# Altium footprint library HedefProjem.PcbLib: 35 footprints (part 3 of 3)
Each footprint in its own frame and in the unit in brackets; x right, y up, seen from the top. Pads: shape width x height; smd on the part's side, far side on the other; paste and mask are expansions set on the pad; w line width, h text height; cw(c..) or ccw(c..) is an arc to the next point about the centre after c.
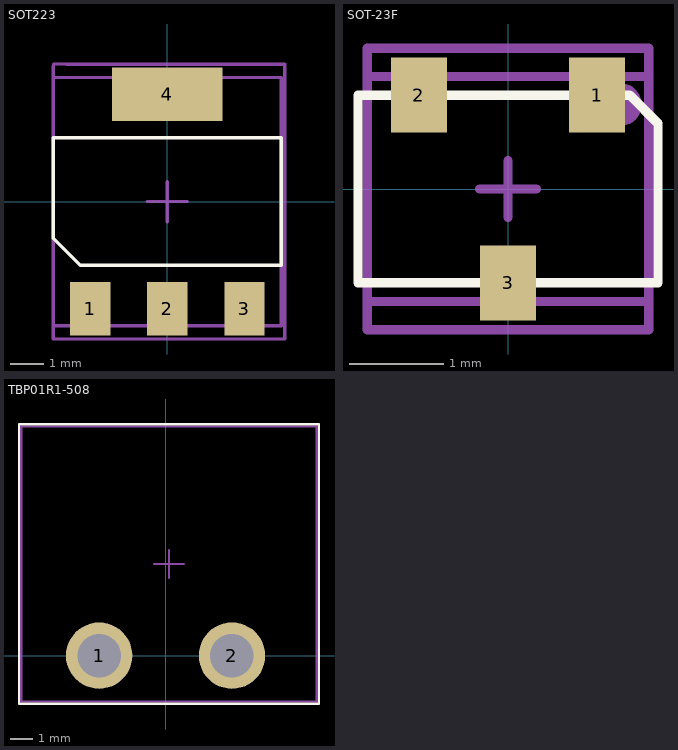
[diagram p2: the footprints below, top view; thin cyan lines are the x and y axes]

## SOT223 [mm]
pads (4):
  rect 1.2x1.6 smd mask+0.05: 1(-2.3,-3.2) 2(0,-3.2) 3(2.3,-3.2)
  rect 3.3x1.6 smd mask+0.05: 4(0,3.2)
Top Overlay:
  lines w0.1: -3.4,-1.1 -2.6,-1.9 3.4,-1.9 3.4,1.9 -3.4,1.9 -3.4,-1.1
Top 3D Body:
  circle w0.3: c-2.6,-3.2 r0.141
  lines w0.1: -3.4,-3.7 -3.4,3.7 3.4,3.7 3.4,-3.7 -3.4,-3.7
Top Component Center:
  lines w0.1: -0.6,0 0.6,0 ; 0,-0.6 0,0.6 ; -3.4,-3.7 3.4,-3.7 3.4,3.7 -3.4,3.7 -3.4,-3.7
Top Designator:
  lines w0.1: -3.4,-4.1 3.5,-4.1 3.5,4.1 -3,4.1 -3.398,4.105 -3.4,4 -3.4,-4.1
  text ".Designator" at -1.446,0.062 h1.52
3D body "sot223_p2-3_l6-7_w3-7.stp": height 1.85, standoff 0.05, extent -3.35,-3.65 3.35,3.65

## SOT-23F [mm]
pads (3):
  rect 0.6x0.8 smd mask+0.05: 1(0.95,1) 2(-0.95,1) 3(0,-1)
Top Overlay:
  lines w0.1: -1.6,-1 -1.6,1 1.3,1 1.6,0.7 1.6,-1 -1.6,-1
Top 3D Body:
  circle w0.254: c1.2,0.9 r0.1
  lines w0.1: -1.5,-1.2 -1.5,1.2 1.5,1.2 1.5,-1.2 -1.5,-1.2
Top Component Center:
  lines w0.1: -0.3,0 0.3,0 ; 0,-0.3 0,0.3 ; -1.5,-1.5 -1.5,1.5 1.5,1.5 1.5,-1.5 -1.5,-1.5
Top Designator:
  lines w0.1: -1.5,-1.5 -1.5,1.5 1.5,1.5 1.5,-1.5 -1.5,-1.5
  text ".Designator" at -0.95,-0.483 h0.8
3D body "User Library-SOT23F.STEP": height 1.01, standoff 0.1, extent -1.45,-1.2 1.45,1.2

## TBP01R1-508 [mm]
pads (2):
  round 2.9 hole 1.9 mask+0.05: 1(-2.9,0) 2(2.9,0)
Top Overlay:
  lines w0.1: -6.4,-2.1 6.7,-2.1 6.7,10.1 -6.4,10.1 -6.4,-2.1
Top 3D Body:
  lines w0.1: -6.3,-2 6.6,-2 6.6,10 -6.3,10 -6.3,-2
Top Component Center:
  lines w0.1: -0.5,4 0.8,4 ; 0.15,3.4 0.15,4.6 ; -6.3,-2 6.6,-2 6.6,10 -6.3,10 -6.3,-2
Top Designator:
  lines w0.1: -6.3,-2 6.6,-2 6.6,10 -6.3,10 -6.3,-2
  text ".Designator" at -3.446,3.062 h1.52
3D body: height 0.1, standoff -3.9, extent -3.75,-0.85 -2.05,0.85
3D body: height 0.1, standoff -3.9, extent 2.05,-0.85 3.75,0.85
3D body: height 8.6, standoff 8.1, extent -6.301,4.922 6.599,10.002
3D body: height 8.1, standoff 0.1, extent -6.3,-2 6.6,10